# Altium schematic symbol library IC_Maxim.SchLib: 843 symbols (part 3 of 20) (continued)
## MAX1720EUT+ (continued)
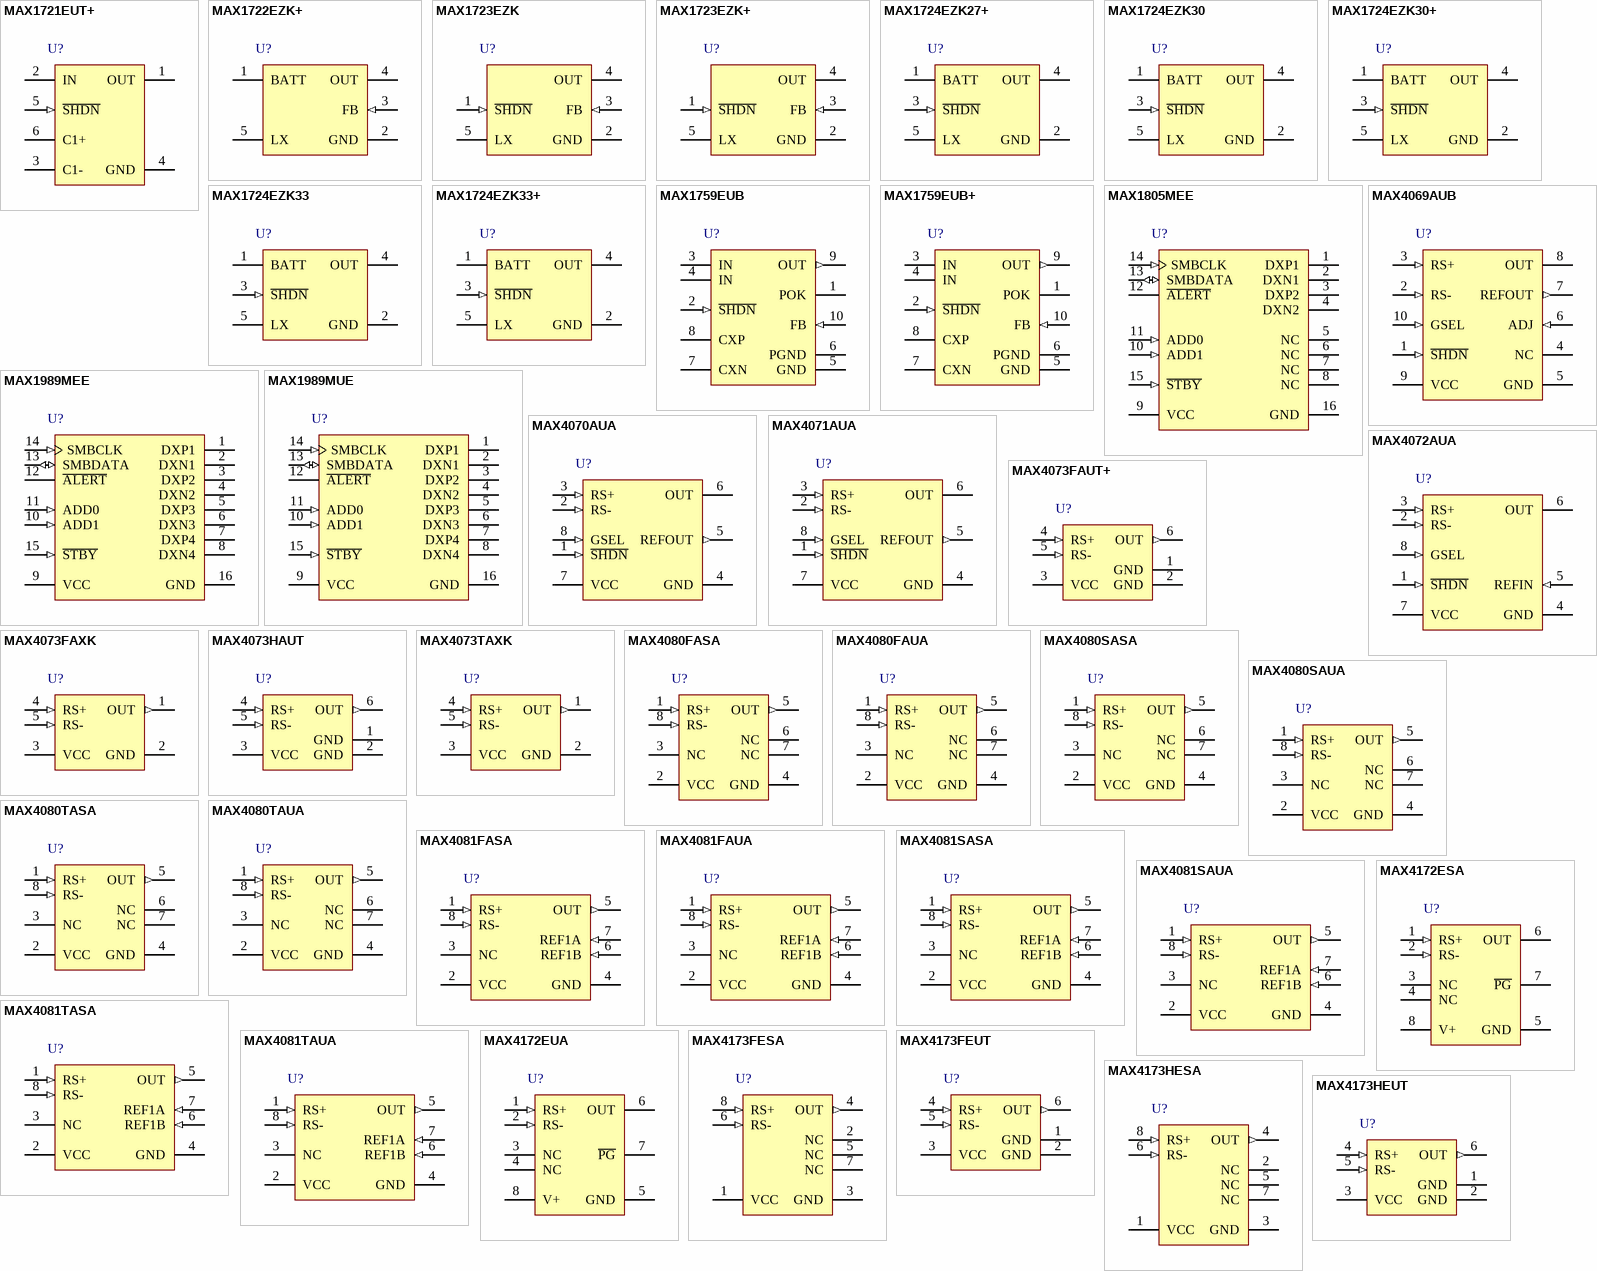
[diagram p3: symbols MAX1721EUT+ to MAX4173HEUT]

## MAX1721EUT+
designator U?
Switched-Capacitor Voltage Inverter with Shutdown, 125kHz, 6-Pin SOT, -40癈 to +85癈, Pb-Free; DatasheetVersion: Rev 2, Apr-2004; PackageVersion: revL, 2011; PackageReference: U6+4; PackageDescription: 6-Pin SOT-23 Package, 0.65 mm Pitch, 2.2 mm Lead Span, Pb-Free; Code_JEDEC: MO-178-AB; ComponentLink1Description: Manufacturer URL; ComponentLink1URL: http://www.maxim-ic.com; ComponentLink2Description: Datasheet; ComponentLink2URL: http://datasheets.maxim-ic.com/en/ds/MAX1719-MAX1721.pdf; ComponentLink3Description: Package Specification; ComponentLink3URL: http://pdfserv.maxim-ic.com/package_dwgs/21-0058.PDF
footprint SOT23-6 (Footprint not found)
pins: 1 OUT (power), 2 IN (power), 3 C1-, 4 GND (power), 5 ~{SHDN} (in), 6 C1+

## MAX1722EZK+
designator U?
1.5uA IQ, Step-Up DC-DC Converter, Adjustable output, LX damping, 5-Pin SOT, -40癈 to +85癈, Pb-Free; DatasheetVersion: Rev 0, Jul-2001; PackageVersion: revD, 2010; PackageReference: Z5+1; PackageDescription: 5-Pin Thin Small-Outline Transistor, 2.9 x 1.6 mm Body, 0.95 mm Pitch, 2.8 mm Lead Span, SOT-23, Pb-Free; Code_JEITA: SC-74; Code_JEDEC: MO-193*; ComponentLink1Description: Manufacturer URL; ComponentLink1URL: http://www.maxim-ic.com; ComponentLink2Description: Datasheet; ComponentLink2URL: http://datasheets.maxim-ic.com/en/ds/MAX1722-MAX1724.pdf; ComponentLink3Description: Package Specification; ComponentLink3URL: http://pdfserv.maxim-ic.com/package_dwgs/21-0113.PDF
footprint SOT23-5 (Footprint not found)
pins: 1 BATT (power), 2 GND (power), 3 FB (in), 4 OUT (power), 5 LX

## MAX1723EZK
designator U?
1.5uA IQ, Step-Up DC-DC Converter, Adjustable output, SHDN, 5-Pin SOT, -40癈 to +85癈; DatasheetVersion: Rev 0, Jul-2001; PackageVersion: revD, 2010; PackageReference: Z5-1; PackageDescription: 5-Pin Thin Small-Outline Transistor, 2.9 x 1.6 mm Body, 0.95 mm Pitch, 2.8 mm Lead Span, SOT-23; Code_JEITA: SC-74; Code_JEDEC: MO-193*; ComponentLink1Description: Manufacturer URL; ComponentLink1URL: http://www.maxim-ic.com; ComponentLink2Description: Datasheet; ComponentLink2URL: http://datasheets.maxim-ic.com/en/ds/MAX1722-MAX1724.pdf; ComponentLink3Description: Package Specification; ComponentLink3URL: http://pdfserv.maxim-ic.com/package_dwgs/21-0113.PDF
footprint SOT23-5 (Footprint not found)
pins: 1 ~{SHDN} (in), 2 GND (power), 3 FB (in), 4 OUT (power), 5 LX

## MAX1723EZK+
designator U?
1.5uA IQ, Step-Up DC-DC Converter, Adjustable output, SHDN, 5-Pin SOT, -40癈 to +85癈, Pb-Free; DatasheetVersion: Rev 0, Jul-2001; PackageVersion: revD, 2010; PackageReference: Z5+1; PackageDescription: 5-Pin Thin Small-Outline Transistor, 2.9 x 1.6 mm Body, 0.95 mm Pitch, 2.8 mm Lead Span, SOT-23, Pb-Free; Code_JEITA: SC-74; Code_JEDEC: MO-193*; ComponentLink1Description: Manufacturer URL; ComponentLink1URL: http://www.maxim-ic.com; ComponentLink2Description: Datasheet; ComponentLink2URL: http://datasheets.maxim-ic.com/en/ds/MAX1722-MAX1724.pdf; ComponentLink3Description: Package Specification; ComponentLink3URL: http://pdfserv.maxim-ic.com/package_dwgs/21-0113.PDF
footprint SOT23-5 (Footprint not found)
pins: 1 ~{SHDN} (in), 2 GND (power), 3 FB (in), 4 OUT (power), 5 LX

## MAX1724EZK27+
designator U?
1.5uA IQ, Step-Up DC-DC Converter, 2.7V output, SHDN, LX damping, 5-Pin SOT, -40癈 to +85癈, Pb-Free; DatasheetVersion: Rev 0, Jul-2001; PackageVersion: revD, 2010; PackageReference: Z5+1; PackageDescription: 5-Pin Thin Small-Outline Transistor, 2.9 x 1.6 mm Body, 0.95 mm Pitch, 2.8 mm Lead Span, SOT-23, Pb-Free; Code_JEITA: SC-74; Code_JEDEC: MO-193*; ComponentLink1Description: Manufacturer URL; ComponentLink1URL: http://www.maxim-ic.com; ComponentLink2Description: Datasheet; ComponentLink2URL: http://datasheets.maxim-ic.com/en/ds/MAX1722-MAX1724.pdf; ComponentLink3Description: Package Specification; ComponentLink3URL: http://pdfserv.maxim-ic.com/package_dwgs/21-0113.PDF
footprint SOT23-5 (Footprint not found)
pins: 1 BATT (power), 2 GND (power), 3 ~{SHDN} (in), 4 OUT (power), 5 LX

## MAX1724EZK30
designator U?
1.5uA IQ, Step-Up DC-DC Converter, 3V output, SHDN, LX damping, 5-Pin SOT, -40癈 to +85癈; DatasheetVersion: Rev 0, Jul-2001; PackageVersion: revD, 2010; PackageReference: Z5-1; PackageDescription: 5-Pin Thin Small-Outline Transistor, 2.9 x 1.6 mm Body, 0.95 mm Pitch, 2.8 mm Lead Span, SOT-23; Code_JEITA: SC-74; Code_JEDEC: MO-193*; ComponentLink1Description: Manufacturer URL; ComponentLink1URL: http://www.maxim-ic.com; ComponentLink2Description: Datasheet; ComponentLink2URL: http://datasheets.maxim-ic.com/en/ds/MAX1722-MAX1724.pdf; ComponentLink3Description: Package Specification; ComponentLink3URL: http://pdfserv.maxim-ic.com/package_dwgs/21-0113.PDF
footprint SOT23-5 (Footprint not found)
pins: 1 BATT (power), 2 GND (power), 3 ~{SHDN} (in), 4 OUT (power), 5 LX

## MAX1724EZK30+
designator U?
1.5uA IQ, Step-Up DC-DC Converter, 3V output, SHDN, LX damping, 5-Pin SOT, -40癈 to +85癈, Pb-Free; DatasheetVersion: Rev 0, Jul-2001; PackageVersion: revD, 2010; PackageReference: Z5+1; PackageDescription: 5-Pin Thin Small-Outline Transistor, 2.9 x 1.6 mm Body, 0.95 mm Pitch, 2.8 mm Lead Span, SOT-23, Pb-Free; Code_JEITA: SC-74; Code_JEDEC: MO-193*; ComponentLink1Description: Manufacturer URL; ComponentLink1URL: http://www.maxim-ic.com; ComponentLink2Description: Datasheet; ComponentLink2URL: http://datasheets.maxim-ic.com/en/ds/MAX1722-MAX1724.pdf; ComponentLink3Description: Package Specification; ComponentLink3URL: http://pdfserv.maxim-ic.com/package_dwgs/21-0113.PDF
footprint SOT23-5 (Footprint not found)
pins: 1 BATT (power), 2 GND (power), 3 ~{SHDN} (in), 4 OUT (power), 5 LX

## MAX1724EZK33
designator U?
1.5uA IQ, Step-Up DC-DC Converter, 3.3V output, SHDN, LX damping, 5-Pin SOT, -40癈 to +85癈; DatasheetVersion: Rev 0, Jul-2001; PackageVersion: revD, 2010; PackageReference: Z5-1; PackageDescription: 5-Pin Thin Small-Outline Transistor, 2.9 x 1.6 mm Body, 0.95 mm Pitch, 2.8 mm Lead Span, SOT-23; Code_JEITA: SC-74; Code_JEDEC: MO-193*; ComponentLink1Description: Manufacturer URL; ComponentLink1URL: http://www.maxim-ic.com; ComponentLink2Description: Datasheet; ComponentLink2URL: http://datasheets.maxim-ic.com/en/ds/MAX1722-MAX1724.pdf; ComponentLink3Description: Package Specification; ComponentLink3URL: http://pdfserv.maxim-ic.com/package_dwgs/21-0113.PDF
footprint SOT23-5 (Footprint not found)
pins: 1 BATT (power), 2 GND (power), 3 ~{SHDN} (in), 4 OUT (power), 5 LX

## MAX1724EZK33+
designator U?
1.5uA IQ, Step-Up DC-DC Converter, 3.3V output, SHDN, LX damping, 5-Pin SOT, -40癈 to +85癈, Pb-Free; DatasheetVersion: Rev 0, Jul-2001; PackageVersion: revD, 2010; PackageReference: Z5+1; PackageDescription: 5-Pin Thin Small-Outline Transistor, 2.9 x 1.6 mm Body, 0.95 mm Pitch, 2.8 mm Lead Span, SOT-23, Pb-Free; Code_JEITA: SC-74; Code_JEDEC: MO-193*; ComponentLink1Description: Manufacturer URL; ComponentLink1URL: http://www.maxim-ic.com; ComponentLink2Description: Datasheet; ComponentLink2URL: http://datasheets.maxim-ic.com/en/ds/MAX1722-MAX1724.pdf; ComponentLink3Description: Package Specification; ComponentLink3URL: http://pdfserv.maxim-ic.com/package_dwgs/21-0113.PDF
footprint SOT23-5 (Footprint not found)
pins: 1 BATT (power), 2 GND (power), 3 ~{SHDN} (in), 4 OUT (power), 5 LX

## MAX1759EUB
designator U?
Buck/Boost Regulating Charge Pump, open-drain POK, 10-Pin uMAX, -40癈 to +85癈; DatasheetVersion: Rev 1, Jun-2000; PackageVersion: revL, 2008; PackageReference: U10-2; PackageDescription: 10-Pin Micro-MAX Thin Shrink Small Outline (uSOP), 3 x 3 x 0.85 mm Body, 0.5 mm Pitch; Code_JEDEC: MO-187-BA; ComponentLink1Description: Manufacturer URL; ComponentLink1URL: http://www.maxim-ic.com; ComponentLink2Description: Datasheet; ComponentLink2URL: http://datasheets.maxim-ic.com/en/ds/MAX1759.pdf; ComponentLink3Description: Package Specification; ComponentLink3URL: http://pdfserv.maxim-ic.com/package_dwgs/21-0061.PDF
footprint VSSOP10_0.5 (Footprint not found)
pins: 1 POK (oc), 2 ~{SHDN} (in), 3 IN (power), 4 IN (power), 5 GND (power), 6 PGND (power), 7 CXN, 8 CXP, 9 OUT (out), 10 FB (in)

## MAX1759EUB+
designator U?
Buck/Boost Regulating Charge Pump, open-drain POK, 10-Pin uMAX, -40癈 to +85癈, Pb-Free; DatasheetVersion: Rev 1, Jun-2000; PackageVersion: revL, 2008; PackageReference: U10+2; PackageDescription: 10-Pin Micro-MAX Thin Shrink Small Outline (uSOP), 3 x 3 x 0.85 mm Body, 0.5 mm Pitch, Pb-Free; Code_JEDEC: MO-187-BA; ComponentLink1Description: Manufacturer URL; ComponentLink1URL: http://www.maxim-ic.com; ComponentLink2Description: Datasheet; ComponentLink2URL: http://datasheets.maxim-ic.com/en/ds/MAX1759.pdf; ComponentLink3Description: Package Specification; ComponentLink3URL: http://pdfserv.maxim-ic.com/package_dwgs/21-0061.PDF
footprint VSSOP10_0.5 (Footprint not found)
pins: 1 POK (oc), 2 ~{SHDN} (in), 3 IN (power), 4 IN (power), 5 GND (power), 6 PGND (power), 7 CXN, 8 CXP, 9 OUT (out), 10 FB (in)

## MAX1805MEE
designator U?
Three-Channel Temperature Sensor with SMBus Serial Interface, 8 Bits Temperature Resolution, -55 to 125 degC, 16-Pin SOP (E16-1); Generic Part Number: MAX1805; PartNumber: MAX1805MEE; Alarm Output: Alert; Functions: Remote & Local Sensor; Interface: 2-Wire/I2C/SMBus; Parasite Pwr.: No; DatasheetVersion: Rev. 2; PackageVersion: Rev. K, 04/2012; PackageReference: E16-1; PackageDescription: 16-Pin Quarter Small-Outline Package (E16-1), Body 4.90 x 3.89 mm, Pitch 0.635 mm; Supplier Part Number 1: N/A; Mounting Technology: Surface Mount; Code_JEDEC: MO137; ComponentLink1Description: Manufacturer URL; ComponentLink1URL: http://www.maximintegrated.com/; ComponentLink2Description: Datasheet; ComponentLink2URL: http://datasheets.maximintegrated.com/en/ds/MAX1668-MAX1989.pdf; ComponentLink3Description: Package Specification; ComponentLink3URL: http://pdfserv.maximintegrated.com/package_dwgs/21-0055.PDF
footprint SSOP16_0.635 (Footprint not found)
pins: 1 DXP1 "Combined Current Source and A/D Positive Input for Remote-Diode Channel. Do not leave DXP floating; connect DXP to DXN if no remote diode is used. Place a 2200pF capacitor between DXP and DXN for noise filtering.", 2 DXN1 "Combined Current Sink and A/D Negative Input. DXN is normally biased to a diode voltage above ground.", 3 DXP2 "Combined Current Source and A/D Positive Input for Remote-Diode Channel. Do not leave DXP floating; connect DXP to DXN if no remote diode is used. Place a 2200pF capacitor between DXP and DXN for noise filtering.", 4 DXN2 "Combined Current Sink and A/D Negative Input. DXN is normally biased to a diode voltage above ground.", 5 NC "No Connection. Not internally connected. Can be used for PC board trace routing.", 6 NC "No Connection. Not internally connected. Can be used for PC board trace routing.", 7 NC "No Connection. Not internally connected. Can be used for PC board trace routing.", 8 NC "No Connection. Not internally connected. Can be used for PC board trace routing.", 9 VCC (power) "Supply Voltage Input, 3V to 5.5V. Bypass to GND with a 0.1uF capacitor. A 200ohm series resistor is recommended but not required for additional noise filtering.", 10 ADD1 (in) "SMBus Address Select Pin (Table 8). ADD0 and ADD1 are sampled upon power-up. Excess capacitance (>50pF) at the address pins when floating can cause addressrecognition problems.", 11 ADD0 (in) "SMBus Slave Address Select Pin", 12 ~{ALERT} (oc) "SMBus Alert (Interrupt) Output, Open Drain", 13 SMBDATA (io) "SMBus Serial-Data Input/Output, Open Drain", 14 SMBCLK (in) "SMBus Serial-Clock Input", 15 ~{STBY} (in) "Hardware Standby Input. Temperature and comparison threshold data are retained in standby mode. Low = standby mode, high = operate mode.", 16 GND (power) "Ground"

## MAX1989MEE
designator U?
Five-Channel Temperature Sensor with SMBus Serial Interface, 8 Bits Temperature Resolution, -55 to 125 degC, 16-Pin SOP (E16-1); Generic Part Number: MAX1989; PartNumber: MAX1989MEE; Alarm Output: Alert; Functions: Remote & Local Sensor; Interface: 2-Wire/I2C/SMBus; Parasite Pwr.: No; DatasheetVersion: Rev. 2; PackageVersion: Rev. K, 04/2012; PackageReference: E16-1; PackageDescription: 16-Pin Quarter Small-Outline Package (E16-1), Body 4.90 x 3.89 mm, Pitch 0.635 mm; Supplier Part Number 1: N/A; Mounting Technology: Surface Mount; Code_JEDEC: MO137; ComponentLink1Description: Manufacturer URL; ComponentLink1URL: http://www.maximintegrated.com/; ComponentLink2Description: Datasheet; ComponentLink2URL: http://datasheets.maximintegrated.com/en/ds/MAX1668-MAX1989.pdf; ComponentLink3Description: Package Specification; ComponentLink3URL: http://pdfserv.maximintegrated.com/package_dwgs/21-0055.PDF
footprint SSOP16_0.635 (Footprint not found)
pins: 1 DXP1 "Combined Current Source and A/D Positive Input for Remote-Diode Channel. Do not leave DXP floating; connect DXP to DXN if no remote diode is used. Place a 2200pF capacitor between DXP and DXN for noise filtering.", 2 DXN1 "Combined Current Sink and A/D Negative Input. DXN is normally biased to a diode voltage above ground.", 3 DXP2 "Combined Current Source and A/D Positive Input for Remote-Diode Channel. Do not leave DXP floating; connect DXP to DXN if no remote diode is used. Place a 2200pF capacitor between DXP and DXN for noise filtering.", 4 DXN2 "Combined Current Sink and A/D Negative Input. DXN is normally biased to a diode voltage above ground.", 5 DXP3 "Combined Current Source and A/D Positive Input for Remote-Diode Channel. Do not leave DXP floating; connect DXP to DXN if no remote diode is used. Place a 2200pF capacitor between DXP and DXN for noise filtering.", 6 DXN3 "Combined Current Sink and A/D Negative Input. DXN is normally biased to a diode voltage above ground.", 7 DXP4 "Combined Current Source and A/D Positive Input for Remote-Diode Channel. Do not leave DXP floating; connect DXP to DXN if no remote diode is used. Place a 2200pF capacitor between DXP and DXN for noise filtering.", 8 DXN4 "Combined Current Sink and A/D Negative Input. DXN is normally biased to a diode voltage above ground.", 9 VCC (power) "Supply Voltage Input, 3V to 5.5V. Bypass to GND with a 0.1uF capacitor. A 200ohm series resistor is recommended but not required for additional noise filtering.", 10 ADD1 (in) "SMBus Address Select Pin (Table 8). ADD0 and ADD1 are sampled upon power-up. Excess capacitance (>50pF) at the address pins when floating can cause addressrecognition problems.", 11 ADD0 (in) "SMBus Slave Address Select Pin", 12 ~{ALERT} (oc) "SMBus Alert (Interrupt) Output, Open Drain", 13 SMBDATA (io) "SMBus Serial-Data Input/Output, Open Drain", 14 SMBCLK (in) "SMBus Serial-Clock Input", 15 ~{STBY} (in) "Hardware Standby Input. Temperature and comparison threshold data are retained in standby mode. Low = standby mode, high = operate mode.", 16 GND (power) "Ground"

## MAX1989MUE
designator U?
Five-Channel Temperature Sensor with SMBus Serial Interface, 8 Bits Temperature Resolution, -55 to 125 degC, 16-Pin SOP (U16-2); Generic Part Number: MAX1989; PartNumber: MAX1989MUE; Alarm Output: Alert; Functions: Remote & Local Sensor; Interface: 2-Wire/I2C/SMBus; Parasite Pwr.: No; DatasheetVersion: Rev. 2; PackageVersion: Rev. L, 07/2010; PackageReference: U16-2; PackageDescription: 16-Pin Thin Shrink Small-Outline Package, Body 4.4 x 5 mm, Pitch 0.65 mm; Supplier Part Number 1: N/A; Mounting Technology: Surface Mount; Code_JEDEC: MO-153; ComponentLink1Description: Manufacturer URL; ComponentLink1URL: http://www.maximintegrated.com/; ComponentLink2Description: Datasheet; ComponentLink2URL: http://datasheets.maximintegrated.com/en/ds/MAX1668-MAX1989.pdf; ComponentLink3Description: Package Specification; ComponentLink3URL: http://pdfserv.maximintegrated.com/package_dwgs/21-0066.PDF
footprint TSSOP16_0.65 (Footprint not found)
pins: 1 DXP1 "Combined Current Source and A/D Positive Input for Remote-Diode Channel. Do not leave DXP floating; connect DXP to DXN if no remote diode is used. Place a 2200pF capacitor between DXP and DXN for noise filtering.", 2 DXN1 "Combined Current Sink and A/D Negative Input. DXN is normally biased to a diode voltage above ground.", 3 DXP2 "Combined Current Source and A/D Positive Input for Remote-Diode Channel. Do not leave DXP floating; connect DXP to DXN if no remote diode is used. Place a 2200pF capacitor between DXP and DXN for noise filtering.", 4 DXN2 "Combined Current Sink and A/D Negative Input. DXN is normally biased to a diode voltage above ground.", 5 DXP3 "Combined Current Source and A/D Positive Input for Remote-Diode Channel. Do not leave DXP floating; connect DXP to DXN if no remote diode is used. Place a 2200pF capacitor between DXP and DXN for noise filtering.", 6 DXN3 "Combined Current Sink and A/D Negative Input. DXN is normally biased to a diode voltage above ground.", 7 DXP4 "Combined Current Source and A/D Positive Input for Remote-Diode Channel. Do not leave DXP floating; connect DXP to DXN if no remote diode is used. Place a 2200pF capacitor between DXP and DXN for noise filtering.", 8 DXN4 "Combined Current Sink and A/D Negative Input. DXN is normally biased to a diode voltage above ground.", 9 VCC (power) "Supply Voltage Input, 3V to 5.5V. Bypass to GND with a 0.1uF capacitor. A 200ohm series resistor is recommended but not required for additional noise filtering.", 10 ADD1 (in) "SMBus Address Select Pin (Table 8). ADD0 and ADD1 are sampled upon power-up. Excess capacitance (>50pF) at the address pins when floating can cause addressrecognition problems.", 11 ADD0 (in) "SMBus Slave Address Select Pin", 12 ~{ALERT} (oc) "SMBus Alert (Interrupt) Output, Open Drain", 13 SMBDATA (io) "SMBus Serial-Data Input/Output, Open Drain", 14 SMBCLK (in) "SMBus Serial-Clock Input", 15 ~{STBY} (in) "Hardware Standby Input. Temperature and comparison threshold data are retained in standby mode. Low = standby mode, high = operate mode.", 16 GND (power) "Ground"

## MAX4069AUB
designator U?
Bidirectional, High-Side Current-Sense Amplifier with Adjustable Reference, 50 V / V, 100 V / V Gain, -40 to 125 degC, 10-Pin SOP (U10-2); PartNumber: MAX4069AUB; Bi-Dir. Curr. Sense: Yes; Industry Qualified: Automotive - General; DatasheetVersion: Rev. 3; PackageVersion: Rev. L, 07/2008; PackageReference: U10-2; PackageDescription: 10-Pin Micro-MAX, Thin Shrink Small-Outline (U10-2), Body 3 x 3 mm, Pitch 0.5 mm; Supplier Part Number 1: MAX4069AUB-ND; Supplier Part Number 2: 700-MAX4069AUB-NR; Gain: 50 V/V, 100 V/V; Mounting Technology: Surface Mount; Code_JEDEC: MO-187; ComponentLink1Description: Manufacturer URL; ComponentLink1URL: http://www.maximintegrated.com/; ComponentLink2Description: Datasheet; ComponentLink2URL: http://datasheets.maximintegrated.com/en/ds/MAX4069-MAX4072.pdf; ComponentLink3Description: Package Specification; ComponentLink3URL: http://pdfserv.maximintegrated.com/package_dwgs/21-0061.PDF
footprint VSSOP10_0.5 (Footprint not found)
pins: 1 ~{SHDN} (in) "Shutdown Input. Drive S\H\D\N\ low to select shutdown mode. Connect S\H\D\N\ to VCC for normal operation.", 2 RS- (in) "Negative Connection to the External Sense Resistor", 3 RS+ (in) "Positive Connection to the External Sense Resistor", 4 NC "No Connection. Not internally connected.", 5 GND (power) "Ground. For thin QFN packages, also make an external connection from GND to the under-side exposed paddle.", 6 ADJ (in) "Adjustable Output Voltage Feedback Input. Connect a resistor-divider between REFOUT, ADJ, and GND", 7 REFOUT (out) "Reference Output Voltage", 8 OUT (hiz) "Voltage Output. The difference voltage, VOUT - VREF, is proportional to the voltage difference between RS+ and RS- and indicates the correct polarity.", 9 VCC (power) "Supply Voltage Input. Bypass VCC to GND with a 0.1礔 capacitor.", 10 GSEL (in) "Gain-Setting Input. Connect GSEL low to select gain = 50V/V, or connect GSEL high to select gain = 100V/V."

## MAX4070AUA
designator U?
Bidirectional, High-Side Current-Sense Amplifier with 2.5 V Reference, 50 V / V, 100 V / V Gain, -40 to 125 degC, 8-Pin SOP (U8-1); PartNumber: MAX4070AUA; Bi-Dir. Curr. Sense: Yes; Industry Qualified: Automotive - General; DatasheetVersion: Rev. 3; PackageVersion: Rev. L, 08/2009; PackageReference: U8-1; PackageDescription: 8-Pin Micro-MAX, Thin Shrink Small-Outline (U8-1), Body 3 x 3 mm, Pitch 0.65mm; Supplier Part Number 1: MAX4070AUA-ND; Supplier Part Number 2: 700-MAX4070AUA-NR; Gain: 50 V/V, 100 V/V; Mounting Technology: Surface Mount; Code_JEDEC: MO-187; ComponentLink1Description: Manufacturer URL; ComponentLink1URL: http://www.maximintegrated.com/; ComponentLink2Description: Datasheet; ComponentLink2URL: http://datasheets.maximintegrated.com/en/ds/MAX4069-MAX4072.pdf; ComponentLink3Description: Package Specification; ComponentLink3URL: http://pdfserv.maximintegrated.com/package_dwgs/21-0036.PDF
footprint VSSOP8_0.65 (Footprint not found)
pins: 1 ~{SHDN} (in) "Shutdown Input. Drive SHDN low to select shutdown mode. Connect SHDN to VCC for normal operation.", 2 RS- (in) "Negative Connection to the External Sense Resistor", 3 RS+ (in) "Positive Connection to the External Sense Resistor", 4 GND (power) "Ground. For thin QFN packages, also make an external connection from GND to the under-side exposed paddle.", 5 REFOUT (out) "Reference Output Voltage.", 6 OUT (hiz) "Voltage Output. The difference voltage, VOUT - VREF, is proportional to the voltage difference between RS+ and RS- and indicates the correct polarity.", 7 VCC (power) "Supply Voltage Input. Bypass VCC to GND with a 0.1uF capacitor.", 8 GSEL (in) "Gain-Setting Input. Connect GSEL low to select gain = 50V/V, or connect GSEL high to select gain = 100V/V."

## MAX4071AUA
designator U?
Bidirectional, High-Side Current-Sense Amplifier with 1.5 V Reference, 50 V / V, 100 V / V Gain, -40 to 125 degC, 8-Pin SOP (U8-1); PartNumber: MAX4071AUA; Bi-Dir. Curr. Sense: Yes; Industry Qualified: Automotive - General; DatasheetVersion: Rev. 3; PackageVersion: Rev. L, 08/2009; PackageReference: U8-1; PackageDescription: 8-Pin Micro-MAX, Thin Shrink Small-Outline (U8-1), Body 3 x 3 mm, Pitch 0.65mm; Supplier Part Number 1: MAX4071AUA-ND; Supplier Part Number 2: 700-MAX4071AUA-NR; Gain: 50 V/V, 100 V/V; Mounting Technology: Surface Mount; Code_JEDEC: MO-187; ComponentLink1Description: Manufacturer URL; ComponentLink1URL: http://www.maximintegrated.com/; ComponentLink2Description: Datasheet; ComponentLink2URL: http://datasheets.maximintegrated.com/en/ds/MAX4069-MAX4072.pdf; ComponentLink3Description: Package Specification; ComponentLink3URL: http://pdfserv.maximintegrated.com/package_dwgs/21-0036.PDF
footprint VSSOP8_0.65 (Footprint not found)
pins: 1 ~{SHDN} (in) "Shutdown Input. Drive SHDN low to select shutdown mode. Connect SHDN to VCC for normal operation.", 2 RS- (in) "Negative Connection to the External Sense Resistor", 3 RS+ (in) "Positive Connection to the External Sense Resistor", 4 GND (power) "Ground. For thin QFN packages, also make an external connection from GND to the under-side exposed paddle.", 5 REFOUT (out) "Reference Output Voltage.", 6 OUT (hiz) "Voltage Output. The difference voltage, VOUT - VREF, is proportional to the voltage difference between RS+ and RS- and indicates the correct polarity.", 7 VCC (power) "Supply Voltage Input. Bypass VCC to GND with a 0.1uF capacitor.", 8 GSEL (in) "Gain-Setting Input. Connect GSEL low to select gain = 50V/V, or connect GSEL high to select gain = 100V/V."

## MAX4072AUA
designator U?
Bidirectional, High-Side Current-Sense Amplifier with Reference Input, 50 V / V, 100 V / V Gain, -40 to 125 degC, 8-Pin SOP (U8-1); PartNumber: MAX4072AUA; Bi-Dir. Curr. Sense: Yes; Industry Qualified: Automotive - General; DatasheetVersion: Rev. 3; PackageVersion: Rev. L, 08/2009; PackageReference: U8-1; PackageDescription: 8-Pin Micro-MAX, Thin Shrink Small-Outline (U8-1), Body 3 x 3 mm, Pitch 0.65mm; Supplier Part Number 1: MAX4072AUA-ND; Supplier Part Number 2: 700-MAX4072AUA-NR; Gain: 50 V/V, 100 V/V; Mounting Technology: Surface Mount; Code_JEDEC: MO-187; ComponentLink1Description: Manufacturer URL; ComponentLink1URL: http://www.maximintegrated.com/; ComponentLink2Description: Datasheet; ComponentLink2URL: http://datasheets.maximintegrated.com/en/ds/MAX4069-MAX4072.pdf; ComponentLink3Description: Package Specification; ComponentLink3URL: http://pdfserv.maximintegrated.com/package_dwgs/21-0036.PDF
footprint VSSOP8_0.65 (Footprint not found)
pins: 1 ~{SHDN} (in) "Shutdown Input. Drive S\H\D\N\ low to select shutdown mode. Connect S\H\D\N\ to VCC for normal operation.", 2 RS- (in) "Negative Connection to the External Sense Resistor", 3 RS+ (in) "Positive Connection to the External Sense Resistor", 4 GND (power) "Ground. For thin QFN packages, also make an external connection from GND to the under-side exposed paddle.", 5 REFIN (in) "Reference Input Voltage.", 6 OUT (hiz) "Voltage Output. The difference voltage, VOUT - VREF, is proportional to the voltage difference between RS+ and RS- and indicates the correct polarity.", 7 VCC (power) "Supply Voltage Input. Bypass VCC to GND with a 0.1uF capacitor.", 8 GSEL (in) "Gain-Setting Input. Connect GSEL low to select gain = 50V/V, or connect GSEL high to select gain = 100V/V."

## MAX4073FAUT+
designator U?
Lowest-Cost, Voltage-Output, High-Side Current-Sense Amplifier, 50 V / V Gain, -40 to 125 degC, 6-Pin SOT23 (U6+4), Pb-Free; PartNumber: MAX4073FAUT+; Bi-Dir. Curr. Sense: No; Gain: 20 V/V, 50 V/V ,100 V/V; Industry Qualified: Automotive - General; DatasheetVersion: Rev. 1; PackageVersion: Rev. N, 08/2012; PackageReference: U6+4; PackageDescription: 6-Pin Small-Outline Transistor Package, Body 1.625 x 2.9 mm, Pitch 0.95 mm; Supplier Part Number 1: N/A; Mounting Technology: Surface Mount; Code_JEDEC: MO-178; ComponentLink1Description: Manufacturer URL; ComponentLink1URL: http://www.maximintegrated.com/; ComponentLink2Description: Datasheet; ComponentLink2URL: http://datasheets.maximintegrated.com/en/ds/MAX4073-MAX4073T.pdf; ComponentLink3Description: Package Specification; ComponentLink3URL: http://pdfserv.maximintegrated.com/package_dwgs/21-0058.PDF
footprint SOT23-6 (Footprint not found)
pins: 1 GND (power) "Ground", 2 GND (power) "Ground", 3 VCC (power) "Supply Voltage Input. Bypass to GND with a 0.1uF capacitor", 4 RS+ (in) "Power-Side Connection to the External Sense Resistor", 5 RS- (in) "Load-Side Connection to the External Sense Resistor", 6 OUT (out) "Voltage Output. VOUT is proportional to VSENSE. Output impedance is approximately 12k ohm."

## MAX4073FAXK
designator U?
Lowest-Cost, Voltage-Output, High-Side Current-Sense Amplifier, 50 V / V Gain, -40 to 125 degC, 5-Pin SC70 (X5-1); PartNumber: MAX4073FAXK; Bi-Dir. Curr. Sense: No; Gain: 20 V/V, 50 V/V ,100 V/V; Industry Qualified: Automotive - General; DatasheetVersion: Rev. 1; PackageVersion: Rev. F, 06/2011; PackageReference: X5-1; PackageDescription: 5-Pin SC70 Transistor Package (X5-1), Body 2 x 1.25 mm, Pitch 0.65 mm; Supplier Part Number 1: N/A; Mounting Technology: Surface Mount; Code_JEDEC: MO-203; ComponentLink1Description: Manufacturer URL; ComponentLink1URL: http://www.maximintegrated.com/; ComponentLink2Description: Datasheet; ComponentLink2URL: http://datasheets.maximintegrated.com/en/ds/MAX4073-MAX4073T.pdf; ComponentLink3Description: Package Specification; ComponentLink3URL: http://pdfserv.maximintegrated.com/package_dwgs/21-0076.PDF
footprint SOT353 (Footprint not found)
pins: 1 OUT (out) "Voltage Output. VOUT is proportional to VSENSE. Output impedance is approximately 12k ohm.", 2 GND (power) "Ground", 3 VCC (power) "Supply Voltage Input. Bypass to GND with a 0.1uF capacitor", 4 RS+ (in) "Power-Side Connection to the External Sense Resistor", 5 RS- (in) "Load-side connection to the external sense resistor"

## MAX4073HAUT
designator U?
Lowest-Cost, Voltage-Output, High-Side Current-Sense Amplifier, 100 V / V Gain, -40 to 125 degC, 6-Pin SOT23 (U6-4); PartNumber: MAX4073HAUT; Bi-Dir. Curr. Sense: No; Gain: 20 V/V, 50 V/V ,100 V/V; Industry Qualified: Automotive - General; DatasheetVersion: Rev. 1; PackageVersion: Rev. N, 08/2012; PackageReference: U6-4; PackageDescription: 6-Pin Small-Outline Transistor Package, Body 1.625 x 2.9 mm, Pitch 0.95 mm; Supplier Part Number 1: N/A; Mounting Technology: Surface Mount; Code_JEDEC: MO-178; ComponentLink1Description: Manufacturer URL; ComponentLink1URL: http://www.maximintegrated.com/; ComponentLink2Description: Datasheet; ComponentLink2URL: http://datasheets.maximintegrated.com/en/ds/MAX4073-MAX4073T.pdf; ComponentLink3Description: Package Specification; ComponentLink3URL: http://pdfserv.maximintegrated.com/package_dwgs/21-0058.PDF
footprint SOT23-6 (Footprint not found)
pins: 1 GND (power) "Ground", 2 GND (power) "Ground", 3 VCC (power) "Supply Voltage Input. Bypass to GND with a 0.1uF capacitor", 4 RS+ (in) "Power-Side Connection to the External Sense Resistor", 5 RS- (in) "Load-Side Connection to the External Sense Resistor", 6 OUT (out) "Voltage Output. VOUT is proportional to VSENSE. Output impedance is approximately 12k ohm."

## MAX4073TAXK
designator U?
Lowest-Cost, Voltage-Output, High-Side Current-Sense Amplifier, 20 V / V Gain, -40 to 125 degC, 5-Pin SC70 (X5-1); PartNumber: MAX4073TAXK; Bi-Dir. Curr. Sense: No; Gain: 20 V/V, 50 V/V ,100 V/V; Industry Qualified: Automotive - General; DatasheetVersion: Rev. 1; PackageVersion: Rev. F, 06/2011; PackageReference: X5-1; PackageDescription: 5-Pin SC70 Transistor Package (X5-1), Body 2 x 1.25 mm, Pitch 0.65 mm; Supplier Part Number 1: N/A; Mounting Technology: Surface Mount; Code_JEDEC: MO-203; ComponentLink1Description: Manufacturer URL; ComponentLink1URL: http://www.maximintegrated.com/; ComponentLink2Description: Datasheet; ComponentLink2URL: http://datasheets.maximintegrated.com/en/ds/MAX4073-MAX4073T.pdf; ComponentLink3Description: Package Specification; ComponentLink3URL: http://pdfserv.maximintegrated.com/package_dwgs/21-0076.PDF
footprint SOT353 (Footprint not found)
pins: 1 OUT (out) "Voltage Output. VOUT is proportional to VSENSE. Output impedance is approximately 12k ohm.", 2 GND (power) "Ground", 3 VCC (power) "Supply Voltage Input. Bypass to GND with a 0.1uF capacitor", 4 RS+ (in) "Power-Side Connection to the External Sense Resistor", 5 RS- (in) "Load-side connection to the external sense resistor"

## MAX4080FASA
designator U?
76 V, High-Side, Uni-directional Current-Sense Amplifier, 5 V / V Gain, -40 to 125 degC, 8-Pin SOIC (S8-2); PartNumber: MAX4080FASA; Bi-Dir. Curr. Sense: No; Gain: 5 V/V, 20 V/V ,60 V/V; Industry Qualified: Automotive - AECQ100, Automotive - General; DatasheetVersion: Rev. 4; PackageVersion: Rev. D, 10/2012; PackageReference: S8-2; PackageDescription: 8-Pin Small-Outline IC, Narrow (0.15in) (S8-2), Body 4.90 x 3.90 mm, Pitch 1.27 mm; Supplier Part Number 1: MAX4080FASA-ND; Supplier Part Number 2: 700-MAX4080FASA-NR; Mounting Technology: Surface Mount; Code_JEDEC: MS012; ComponentLink1Description: Manufacturer URL; ComponentLink1URL: http://www.maximintegrated.com/; ComponentLink2Description: Datasheet; ComponentLink2URL: http://datasheets.maximintegrated.com/en/ds/MAX4080-MAX4081.pdf; ComponentLink3Description: Package Specification; ComponentLink3URL: http://pdfserv.maximintegrated.com/package_dwgs/21-0041.PDF
footprint SOIC8_1.27 (Footprint not found)
pins: 1 RS+ (in) "Power connection to the external-sense resistor.", 2 VCC (power) "Supply Voltage Input. Decouple VCC to GND with at least a 0.1uF capacitor to bypass line transients.", 3 NC "No Connection. No internal connection. Leave open or connect to ground.", 4 GND (power) "Ground", 5 OUT (out) "Voltage Output. For the unidirectional MAX4080, VOUT is proportional to VSENSE. For the bidirectional MAX4081, the difference voltage (VOUT - VREF) is proportional to VSENSE and indicates the correct polarity.", 6 NC "No Connection. No internal connection. Leave open or connect to ground.", 7 NC "No Connection. No internal connection. Leave open or connect to ground.", 8 RS- (in) "Load connection to the external sense resistor."

## MAX4080FAUA
designator U?
76 V, High-Side, Uni-directional Current-Sense Amplifier, 5 V / V Gain, -40 to 125 degC, 8-Pin SOP (U8-1); PartNumber: MAX4080FAUA; Bi-Dir. Curr. Sense: No; Gain: 5 V/V, 20 V/V ,60 V/V; Industry Qualified: Automotive - AECQ100, Automotive - General; DatasheetVersion: Rev. 4; PackageVersion: Rev. L, 08/2009; PackageReference: U8-1; PackageDescription: 8-Pin Micro-MAX, Thin Shrink Small-Outline (U8-1), Body 3 x 3 mm, Pitch 0.65mm; Supplier Part Number 1: N/A; Mounting Technology: Surface Mount; Code_JEDEC: MO-187; ComponentLink1Description: Manufacturer URL; ComponentLink1URL: http://www.maximintegrated.com/; ComponentLink2Description: Datasheet; ComponentLink2URL: http://datasheets.maximintegrated.com/en/ds/MAX4080-MAX4081.pdf; ComponentLink3Description: Package Specification; ComponentLink3URL: http://pdfserv.maximintegrated.com/package_dwgs/21-0036.PDF
footprint VSSOP8_0.65 (Footprint not found)
pins: 1 RS+ (in) "Power connection to the external-sense resistor.", 2 VCC (power) "Supply Voltage Input. Decouple VCC to GND with at least a 0.1uF capacitor to bypass line transients.", 3 NC "No Connection. No internal connection. Leave open or connect to ground.", 4 GND (power) "Ground", 5 OUT (out) "Voltage Output. For the unidirectional MAX4080, VOUT is proportional to VSENSE. For the bidirectional MAX4081, the difference voltage (VOUT - VREF) is proportional to VSENSE and indicates the correct polarity.", 6 NC "No Connection. No internal connection. Leave open or connect to ground.", 7 NC "No Connection. No internal connection. Leave open or connect to ground.", 8 RS- (in) "Load connection to the external sense resistor."

## MAX4080SASA
designator U?
76 V, High-Side, Uni-directional Current-Sense Amplifier, 60 V / V Gain, -40 to 125 degC, 8-Pin SOIC (S8-2); PartNumber: MAX4080SASA; Bi-Dir. Curr. Sense: No; Gain: 5 V/V, 20 V/V ,60 V/V; Industry Qualified: Automotive - AECQ100, Automotive - General; DatasheetVersion: Rev. 4; PackageVersion: Rev. D, 10/2012; PackageReference: S8-2; PackageDescription: 8-Pin Small-Outline IC, Narrow (0.15in) (S8-2), Body 4.90 x 3.90 mm, Pitch 1.27 mm; Supplier Part Number 1: MAX4080SASA-ND; Supplier Part Number 2: 700-MAX4080SASA-NR; Mounting Technology: Surface Mount; Code_JEDEC: MS012; ComponentLink1Description: Manufacturer URL; ComponentLink1URL: http://www.maximintegrated.com/; ComponentLink2Description: Datasheet; ComponentLink2URL: http://datasheets.maximintegrated.com/en/ds/MAX4080-MAX4081.pdf; ComponentLink3Description: Package Specification; ComponentLink3URL: http://pdfserv.maximintegrated.com/package_dwgs/21-0041.PDF
footprint SOIC8_1.27 (Footprint not found)
pins: 1 RS+ (in) "Power connection to the external-sense resistor.", 2 VCC (power) "Supply Voltage Input. Decouple VCC to GND with at least a 0.1uF capacitor to bypass line transients.", 3 NC "No Connection. No internal connection. Leave open or connect to ground.", 4 GND (power) "Ground", 5 OUT (out) "Voltage Output. For the unidirectional MAX4080, VOUT is proportional to VSENSE. For the bidirectional MAX4081, the difference voltage (VOUT - VREF) is proportional to VSENSE and indicates the correct polarity.", 6 NC "No Connection. No internal connection. Leave open or connect to ground.", 7 NC "No Connection. No internal connection. Leave open or connect to ground.", 8 RS- (in) "Load connection to the external sense resistor."

## MAX4080SAUA
designator U?
76 V, High-Side, Uni-directional Current-Sense Amplifier, 60 V / V Gain, -40 to 125 degC, 8-Pin SOP (U8-1); PartNumber: MAX4080SAUA; Bi-Dir. Curr. Sense: No; Gain: 5 V/V, 20 V/V ,60 V/V; Industry Qualified: Automotive - AECQ100, Automotive - General; DatasheetVersion: Rev. 4; PackageVersion: Rev. L, 08/2009; PackageReference: U8-1; PackageDescription: 8-Pin Micro-MAX, Thin Shrink Small-Outline (U8-1), Body 3 x 3 mm, Pitch 0.65mm; Supplier Part Number 1: 700-MAX4080SAUA-NR; Mounting Technology: Surface Mount; Code_JEDEC: MO-187; ComponentLink1Description: Manufacturer URL; ComponentLink1URL: http://www.maximintegrated.com/; ComponentLink2Description: Datasheet; ComponentLink2URL: http://datasheets.maximintegrated.com/en/ds/MAX4080-MAX4081.pdf; ComponentLink3Description: Package Specification; ComponentLink3URL: http://pdfserv.maximintegrated.com/package_dwgs/21-0036.PDF
footprint VSSOP8_0.65 (Footprint not found)
pins: 1 RS+ (in) "Power connection to the external-sense resistor.", 2 VCC (power) "Supply Voltage Input. Decouple VCC to GND with at least a 0.1uF capacitor to bypass line transients.", 3 NC "No Connection. No internal connection. Leave open or connect to ground.", 4 GND (power) "Ground", 5 OUT (out) "Voltage Output. For the unidirectional MAX4080, VOUT is proportional to VSENSE. For the bidirectional MAX4081, the difference voltage (VOUT - VREF) is proportional to VSENSE and indicates the correct polarity.", 6 NC "No Connection. No internal connection. Leave open or connect to ground.", 7 NC "No Connection. No internal connection. Leave open or connect to ground.", 8 RS- (in) "Load connection to the external sense resistor."

## MAX4080TASA
designator U?
76 V, High-Side, Uni-directional Current-Sense Amplifier, 20 V / V Gain, -40 to 125 degC, 8-Pin SOIC (S8-2); PartNumber: MAX4080TASA; Bi-Dir. Curr. Sense: No; Gain: 5 V/V, 20 V/V ,60 V/V; Industry Qualified: Automotive - AECQ100, Automotive - General; DatasheetVersion: Rev. 4; PackageVersion: Rev. D, 10/2012; PackageReference: S8-2; PackageDescription: 8-Pin Small-Outline IC, Narrow (0.15in) (S8-2), Body 4.90 x 3.90 mm, Pitch 1.27 mm; Supplier Part Number 1: MAX4080TASA-ND; Supplier Part Number 2: 700-MAX4080TASA-NR; Mounting Technology: Surface Mount; Code_JEDEC: MS012; ComponentLink1Description: Manufacturer URL; ComponentLink1URL: http://www.maximintegrated.com/; ComponentLink2Description: Datasheet; ComponentLink2URL: http://datasheets.maximintegrated.com/en/ds/MAX4080-MAX4081.pdf; ComponentLink3Description: Package Specification; ComponentLink3URL: http://pdfserv.maximintegrated.com/package_dwgs/21-0041.PDF
footprint SOIC8_1.27 (Footprint not found)
pins: 1 RS+ (in) "Power connection to the external-sense resistor.", 2 VCC (power) "Supply Voltage Input. Decouple VCC to GND with at least a 0.1uF capacitor to bypass line transients.", 3 NC "No Connection. No internal connection. Leave open or connect to ground.", 4 GND (power) "Ground", 5 OUT (out) "Voltage Output. For the unidirectional MAX4080, VOUT is proportional to VSENSE. For the bidirectional MAX4081, the difference voltage (VOUT - VREF) is proportional to VSENSE and indicates the correct polarity.", 6 NC "No Connection. No internal connection. Leave open or connect to ground.", 7 NC "No Connection. No internal connection. Leave open or connect to ground.", 8 RS- (in) "Load connection to the external sense resistor."

## MAX4080TAUA
designator U?
76 V, High-Side, Uni-directional Current-Sense Amplifier, 20 V / V Gain, -40 to 125 degC, 8-Pin SOP (U8-1); PartNumber: MAX4080TAUA; Bi-Dir. Curr. Sense: No; Gain: 5 V/V, 20 V/V ,60 V/V; Industry Qualified: Automotive - AECQ100, Automotive - General; DatasheetVersion: Rev. 4; PackageVersion: Rev. L, 08/2009; PackageReference: U8-1; PackageDescription: 8-Pin Micro-MAX, Thin Shrink Small-Outline (U8-1), Body 3 x 3 mm, Pitch 0.65mm; Supplier Part Number 1: MAX4080TAUA-ND; Supplier Part Number 2: 700-MAX4080TAUA-NR; Mounting Technology: Surface Mount; Code_JEDEC: MO-187; ComponentLink1Description: Manufacturer URL; ComponentLink1URL: http://www.maximintegrated.com/; ComponentLink2Description: Datasheet; ComponentLink2URL: http://datasheets.maximintegrated.com/en/ds/MAX4080-MAX4081.pdf; ComponentLink3Description: Package Specification; ComponentLink3URL: http://pdfserv.maximintegrated.com/package_dwgs/21-0036.PDF
footprint VSSOP8_0.65 (Footprint not found)
pins: 1 RS+ (in) "Power connection to the external-sense resistor.", 2 VCC (power) "Supply Voltage Input. Decouple VCC to GND with at least a 0.1uF capacitor to bypass line transients.", 3 NC "No Connection. No internal connection. Leave open or connect to ground.", 4 GND (power) "Ground", 5 OUT (out) "Voltage Output. For the unidirectional MAX4080, VOUT is proportional to VSENSE. For the bidirectional MAX4081, the difference voltage (VOUT - VREF) is proportional to VSENSE and indicates the correct polarity.", 6 NC "No Connection. No internal connection. Leave open or connect to ground.", 7 NC "No Connection. No internal connection. Leave open or connect to ground.", 8 RS- (in) "Load connection to the external sense resistor."

## MAX4081FASA
designator U?
76 V, High-Side, Bi-directional Current-Sense Amplifier, 5 V / V Gain, -40 to 125 degC, 8-Pin SOIC (S8-2); PartNumber: MAX4081FASA; Bi-Dir. Curr. Sense: Yes; Gain: 5 V/V, 20 V/V ,60 V/V; Industry Qualified: Automotive - AECQ100, Automotive - General; DatasheetVersion: Rev. 4; PackageVersion: Rev. D, 10/2012; PackageReference: S8-2; PackageDescription: 8-Pin Small-Outline IC, Narrow (0.15in) (S8-2), Body 4.90 x 3.90 mm, Pitch 1.27 mm; Supplier Part Number 1: MAX4081FASA-ND; Supplier Part Number 2: 700-MAX4081FASA-NR; Mounting Technology: Surface Mount; Code_JEDEC: MS012; ComponentLink1Description: Manufacturer URL; ComponentLink1URL: http://www.maximintegrated.com/; ComponentLink2Description: Datasheet; ComponentLink2URL: http://datasheets.maximintegrated.com/en/ds/MAX4080-MAX4081.pdf; ComponentLink3Description: Package Specification; ComponentLink3URL: http://pdfserv.maximintegrated.com/package_dwgs/21-0041.PDF
footprint SOIC8_1.27 (Footprint not found)
pins: 1 RS+ (in) "Power connection to the external-sense resistor.", 2 VCC (power) "Supply Voltage Input. Decouple VCC to GND with at least a 0.1uF capacitor to bypass line transients.", 3 NC "No Connection. No internal connection. Leave open or connect to ground.", 4 GND (power) "Ground", 5 OUT (out) "Voltage Output. For the unidirectional MAX4080, VOUT is proportional to VSENSE. For the bidirectional MAX4081, the difference voltage (VOUT - VREF) is proportional to VSENSE and indicates the correct polarity.", 6 REF1B (in) "Reference Voltage Input: Connect REF1B to REF1A or to GND (see the External Reference section).", 7 REF1A (in) "Reference Voltage Input: Connect REF1A and REF1B to a fixed reference voltage (VREF). VOUT is equal to VREF when VSENSE is zero (see the External Reference section).", 8 RS- (in) "Load connection to the external sense resistor."

## MAX4081FAUA
designator U?
76 V, High-Side, Bi-directional Current-Sense Amplifier, 5 V / V Gain, -40 to 125 degC, 8-Pin SOP (U8-1); PartNumber: MAX4081FAUA; Bi-Dir. Curr. Sense: Yes; Gain: 5 V/V, 20 V/V ,60 V/V; Industry Qualified: Automotive - AECQ100, Automotive - General; DatasheetVersion: Rev. 4; PackageVersion: Rev. L, 08/2009; PackageReference: U8-1; PackageDescription: 8-Pin Micro-MAX, Thin Shrink Small-Outline (U8-1), Body 3 x 3 mm, Pitch 0.65mm; Supplier Part Number 1: MAX4081FAUA-ND; Supplier Part Number 2: 700-MAX4081FAUA-NR; Mounting Technology: Surface Mount; Code_JEDEC: MO-187; ComponentLink1Description: Manufacturer URL; ComponentLink1URL: http://www.maximintegrated.com/; ComponentLink2Description: Datasheet; ComponentLink2URL: http://datasheets.maximintegrated.com/en/ds/MAX4080-MAX4081.pdf; ComponentLink3Description: Package Specification; ComponentLink3URL: http://pdfserv.maximintegrated.com/package_dwgs/21-0036.PDF
footprint VSSOP8_0.65 (Footprint not found)
pins: 1 RS+ (in) "Power connection to the external-sense resistor.", 2 VCC (power) "Supply Voltage Input. Decouple VCC to GND with at least a 0.1uF capacitor to bypass line transients.", 3 NC "No Connection. No internal connection. Leave open or connect to ground.", 4 GND (power) "Ground", 5 OUT (out) "Voltage Output. For the unidirectional MAX4080, VOUT is proportional to VSENSE. For the bidirectional MAX4081, the difference voltage (VOUT - VREF) is proportional to VSENSE and indicates the correct polarity.", 6 REF1B (in) "Reference Voltage Input: Connect REF1B to REF1A or to GND (see the External Reference section).", 7 REF1A (in) "Reference Voltage Input: Connect REF1A and REF1B to a fixed reference voltage (VREF). VOUT is equal to VREF when VSENSE is zero (see the External Reference section).", 8 RS- (in) "Load connection to the external sense resistor."